# Altium footprint library Modules.PCBLIB: 11 footprints
Each footprint in its own frame and in the unit in brackets; x right, y up, seen from the top. Pads: shape width x height; smd on the part's side, far side on the other; paste and mask are expansions set on the pad; w line width, h text height; cw(c..) or ccw(c..) is an arc to the next point about the centre after c.
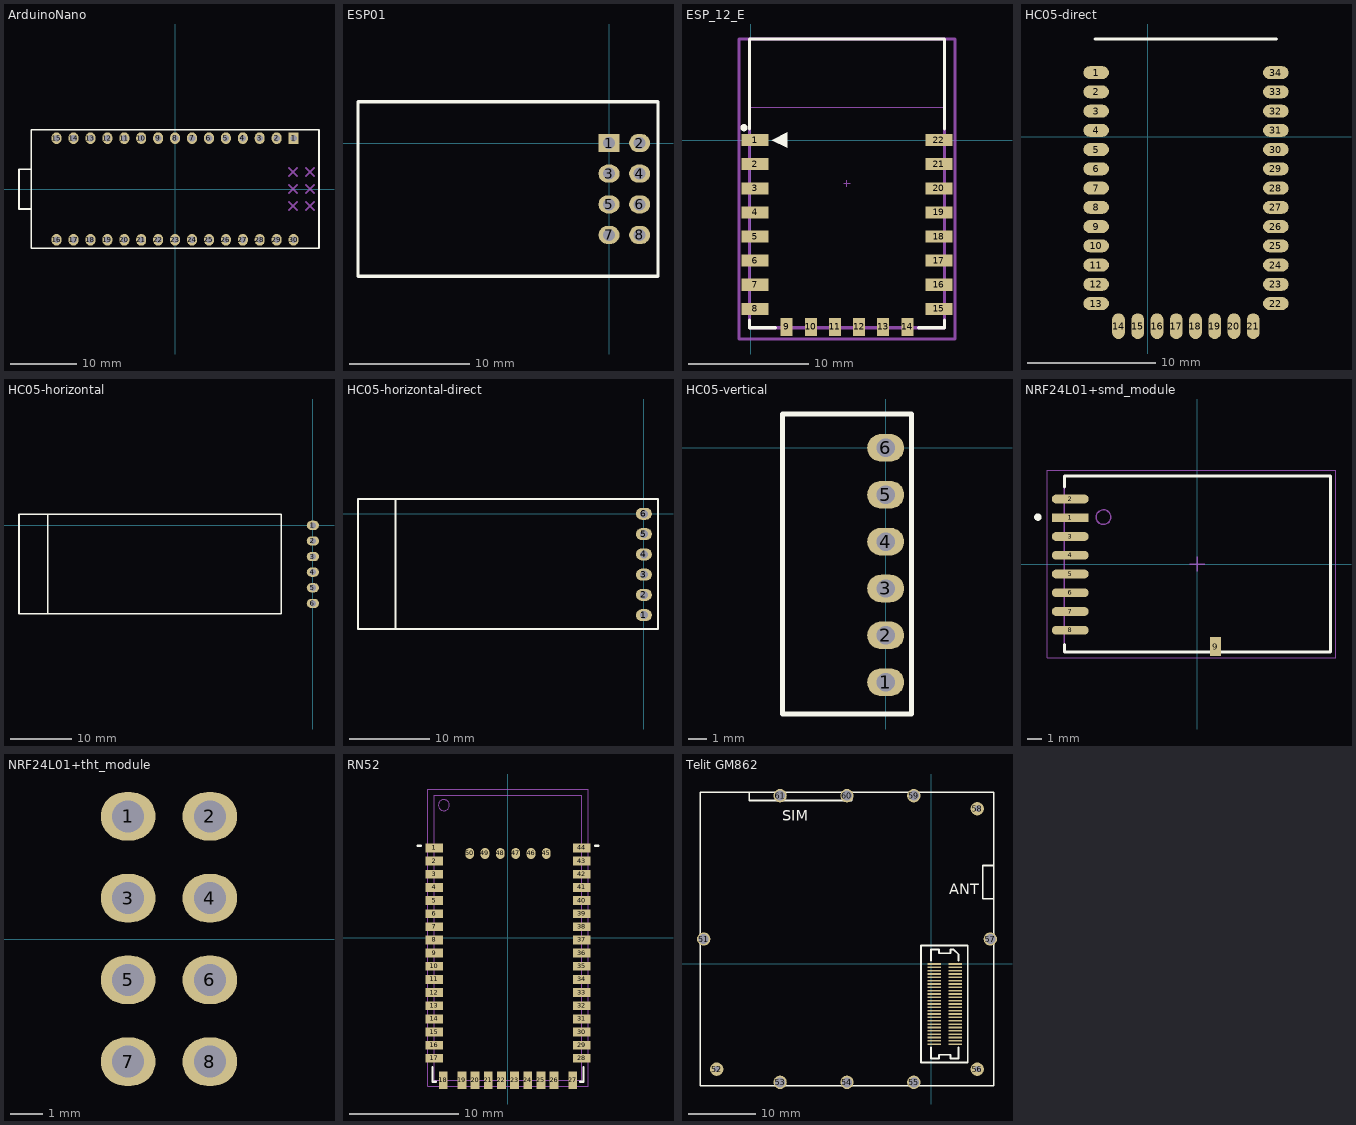
[diagram p0: the footprints below, top view; thin cyan lines are the x and y axes]

## ArduinoNano [mm]
pads (30):
  rect 1.5x1.75 hole 1: 1(17.78,7.62)
  oval 1.5x1.75 hole 1: 2(15.24,7.62) 3(12.7,7.62) 4(10.16,7.62) 5(7.62,7.62) 6(5.08,7.62) 7(2.54,7.62) 8(0,7.62) 9(-2.54,7.62) 10(-5.08,7.62) 11(-7.62,7.62) 12(-10.16,7.62) 13(-12.7,7.62) 14(-15.24,7.62) 15(-17.78,7.62) 16(-17.78,-7.62) 17(-15.24,-7.62) 18(-12.7,-7.62) 19(-10.16,-7.62) 20(-7.62,-7.62) 21(-5.08,-7.62) 22(-2.54,-7.62) 23(0,-7.62) 24(2.54,-7.62) 25(5.08,-7.62) 26(7.62,-7.62) 27(10.16,-7.62) 28(12.7,-7.62) 29(15.24,-7.62) 30(17.78,-7.62)
Top Overlay:
  lines w0.254: -21.59,-2.997 -23.419,-2.997 -23.419,2.972 -21.59,2.972 ; -21.59,2 -21.59,8.89 ; -21.59,8.89 -21.59,-8.89 21.59,-8.89 21.59,8.89 -21.59,8.89
Mechanical 3:
  lines w0.254: 17.043,-3.175 18.313,-1.905 ; 17.043,-1.905 18.313,-3.175 ; 17.043,-0.635 18.313,0.635 ; 17.043,0.635 18.313,-0.635 ; 17.043,1.905 18.313,3.175 ; 17.043,3.175 18.313,1.905 ; 19.583,-3.175 20.853,-1.905 ; 19.583,-1.905 20.853,-3.175 ; 19.583,-0.635 20.853,0.635 ; 19.583,0.635 20.853,-0.635 ; 19.583,1.905 20.853,3.175 ; 19.583,3.175 20.853,1.905
Top DesignatorDoc:
  text ".Designator" at 0,0 h1.5

## ESP01 [mm]
pads (8):
  rect 1.75x1.5 hole 1: 1(0,0)
  oval 1.75x1.5 hole 1: 2(2.54,0) 3(0,-2.54) 4(2.54,-2.54) 5(0,-5.08) 6(2.54,-5.08) 7(0,-7.62) 8(2.54,-7.62)
Top Overlay:
  lines w0.254: -20.828,-11.049 4.064,-11.049 4.064,3.429 -20.828,3.429 -20.828,-11.049
3D body "ESP-01.step": height 11.69, standoff 0.01, extent -20.76,-11.06 4.04,3.44

## ESP_12_E [mm]
pads (22):
  rect 2.25x1 smd: 1(0.375,0) 2(0.375,-2) 3(0.375,-4) 4(0.375,-6) 5(0.375,-8) 6(0.375,-10) 7(0.375,-12) 8(0.375,-14) 15(15.625,-14) 16(15.625,-12) 17(15.625,-10) 18(15.625,-8) 19(15.625,-6) 20(15.625,-4) 21(15.625,-2) 22(15.625,0)
  rect 1x1.5 smd: 9(3,-15.5) 10(5,-15.5) 11(7,-15.5) 12(9,-15.5) 13(11,-15.5) 14(13,-15.5)
Top Overlay:
  circle w0.3: c-0.55,1.025 r0.15
  region: 1.77,0 3.04,-0.635 3.04,0.635
  lines w0.254: -0.084,-14.916 -0.084,-15.568 2.068,-15.568 ; -0.084,0.916 -0.084,8.371 16.084,8.371 16.084,0.916 ; 13.932,-15.568 16.084,-15.568 16.084,-14.916
Top Body, 3D Models:
  lines w0.051: -0.127,2.727 16.129,2.727 16.129,8.382 -0.127,8.382 -0.127,2.727
  lines w0.254: -0.084,-15.568 -0.084,8.371 16.084,8.371 16.084,-15.568 -0.084,-15.568
  text "ANTENNA AREA" at 0.127,7.874 h0.25
  text "CUTOUT POLYGON" at 0.127,7.366 h0.25
Top Courtyard:
  lines w0.1: 7.746,-3.598 8.254,-3.598 ; 8,-3.852 8,-3.344
  lines w0.254: -0.975,-16.5 16.975,-16.5 16.975,8.371 -0.975,8.371 -0.975,-16.5
3D body "ESP_12_E.STEP": height 2.75, standoff 0.04, extent 0.001,-15.491 16.001,8.509

## HC05-direct [mm]
pads (34):
  rrect100% 2x1 smd: 1(-4,5) 2(-4,3.5) 3(-4,2) 4(-4,0.5) 5(-4,-1) 6(-4,-2.5) 7(-4,-4) 8(-4,-5.5) 9(-4,-7) 10(-4,-8.5) 11(-4,-10) 12(-4,-11.5) 13(-4,-13) 22(10,-13) 23(10,-11.5) 24(10,-10) 25(10,-8.5) 26(10,-7) 27(10,-5.5) 28(10,-4) 29(10,-2.5) 30(10,-1) 31(10,0.5) 32(10,2) 33(10,3.5) 34(10,5)
  rrect100% 1x2 smd: 14(-2.26,-14.76) 15(-0.76,-14.76) 16(0.74,-14.76) 17(2.24,-14.76) 18(3.74,-14.76) 19(5.24,-14.76) 20(6.74,-14.76) 21(8.24,-14.76)
Top Overlay:
  lines w0.254: -4.064,7.62 10.033,7.62
3D body "Bluetooth HC-05_.step": height 2.35, standoff 0, extent -4.02,-14.76 10,13.25

## HC05-horizontal [mm]
pads (6):
  oval 2x1.5 hole 1: 1(0,0) 2(0,-2.54) 3(0,-5.08) 4(0,-7.62) 5(0,-10.16) 6(0,-12.7)
Top Overlay:
  lines w0.254: -43.133,-14.421 -43.133,1.835 ; -47.832,-14.421 -5.16,-14.421 -5.16,1.835 -47.832,1.835 -47.832,-14.421
3D body "hc05.step": height 7, standoff 1.1, extent -47.832,-14.264 -5.232,1.836

## HC05-horizontal-direct [mm]
pads (6):
  oval 2x1.5 hole 1: 1(0,-12.7) 2(0,-10.16) 3(0,-7.62) 4(0,-5.08) 5(0,-2.54) 6(0,0)
Top Overlay:
  lines w0.254: -31.133,-14.421 -31.133,1.835 ; -35.832,-14.421 -35.832,1.835 1.76,1.835 1.76,-14.421 -35.832,-14.421
3D body "hc05.step": height 5.9, standoff 0, extent -35.75,-14.3 6.85,1.8

## HC05-vertical [mm]
pads (6):
  oval 2x1.5 hole 1: 1(0,-12.7) 2(0,-10.16) 3(0,-7.62) 4(0,-5.08) 5(0,-2.54) 6(0,0)
Top Overlay:
  lines w0.254: -5.588,-14.421 1.397,-14.421 1.397,1.835 -5.588,1.835 -5.588,-14.421
3D body "hc05.step": height 42.61, standoff 0.01, extent -5.482,-14.34 0.433,1.76

## NRF24L01+smd_module [mm]
height 1.75
pads (9):
  rect 2.5x0.6 smd: 1(-8.6,3.131)
  oval 2.5x0.6 smd: 2(-8.6,4.401) 3(-8.6,1.861) 4(-8.6,0.591) 5(-8.6,-0.679) 6(-8.6,-1.949) 7(-8.6,-3.219) 8(-8.6,-4.489)
  rect 0.762x1.27 smd: 9(1.245,-5.588)
Top Overlay:
  circle w0.25: c-10.795,3.175 r0.125
  lines w0.2: -9,-5.461 -9,-5.969 9.017,-5.969 9.017,5.969 -9,5.969 -9,5.207
Top Body, 3D Models:
  circle w0.1: c-6.35,3.175 r0.5
  lines w0.1: -9.017,-5.969 -9.017,5.969 9.017,5.969 9.017,-5.969 -9.017,-5.969
Top Courtyard:
  lines w0.05: -10.16,-6.35 -10.16,6.35 9.398,6.35 9.398,-6.35 -10.16,-6.35
  lines w0.1: -0.5,0 0.5,0 ; 0,-0.5 0,0.5
3D body "nrf24l01+smd.step": height 0.8, standoff 0, extent -9,-6 9,6

## NRF24L01+tht_module [mm]
pads (8):
  oval 1.7x1.5 hole 1: 1(-10.16,3.81) 2(-7.62,3.81) 3(-10.16,1.27) 4(-7.62,1.27) 5(-10.16,-1.27) 6(-7.62,-1.27) 7(-10.16,-3.81) 8(-7.62,-3.81)
3D body "NRF24L01-tht.STEP": height 6.21, standoff -6.24, extent -11.753,-9.615 17.247,5.385

## RN52 [mm] "RN52 module - custom footprint"
height 2.7
pads (50):
  rect 1.6x0.8 smd: 1(-6.75,8.2) 2(-6.75,7) 3(-6.75,5.8) 4(-6.75,4.6) 5(-6.75,3.4) 6(-6.75,2.2) 7(-6.75,1) 8(-6.75,-0.2) 9(-6.75,-1.4) 10(-6.75,-2.6) 11(-6.75,-3.8) 12(-6.75,-5) 13(-6.75,-6.2) 14(-6.75,-7.4) 15(-6.75,-8.6) 16(-6.75,-9.8) 17(-6.75,-11) 28(6.75,-11) 29(6.75,-9.8) 30(6.75,-8.6) 31(6.75,-7.4) 32(6.75,-6.2) 33(6.75,-5) 34(6.75,-3.8) 35(6.75,-2.6) 36(6.75,-1.4) 37(6.75,-0.2) 38(6.75,1) 39(6.75,2.2) 40(6.75,3.4) 41(6.75,4.6) 42(6.75,5.8) 43(6.75,7) 44(6.75,8.2)
  rect 0.8x1.6 smd: 18(-5.9,-13) 19(-4.2,-13) 20(-3,-13) 21(-1.8,-13) 22(-0.6,-13) 23(0.6,-13) 24(1.8,-13) 25(3,-13) 26(4.2,-13) 27(5.9,-13)
  oval 0.8x1 smd: 45(3.5,7.7) 46(2.1,7.7) 47(0.7,7.7) 48(-0.7,7.7) 49(-2.1,7.7) 50(-3.5,7.7)
Top Overlay:
  lines w0.2: -8.25,8.4 -7.95,8.4 ; -6.9,-11.796 -6.9,-13.146 -6.6,-13.146 ; 6.6,-13.146 6.9,-13.146 6.9,-11.796 ; 7.95,8.4 8.25,8.4
Top Body, 3D Models:
  circle w0.1: c-5.85,12.104 r0.5
  lines w0.1: -6.75,-12.996 6.75,-12.996 6.75,13.004 -6.75,13.004 -6.75,-12.996
Top Courtyard:
  lines w0.05: -7.325,-13.571 7.325,-13.571 7.325,13.579 -7.325,13.579 -7.325,-13.571
3D body "User Library-RN52.STEP": height 2.72, standoff -0.01, extent -6.75,-13 6.77,13.01

## Telit GM862 [mm]
pads (61):
  rect 2x0.25 smd: 1(0.5,0) 2(3.6,0) 3(0.5,-0.5) 4(3.6,-0.5) 5(0.5,-1) 6(3.6,-1) 7(0.5,-1.5) 8(3.6,-1.5) 9(0.5,-2) 10(3.6,-2) 11(0.5,-2.5) 12(3.6,-2.5) 13(0.5,-3) 14(3.6,-3) 15(0.5,-3.5) 16(3.6,-3.5) 17(0.5,-4) 18(3.6,-4) 19(0.5,-4.5) 20(3.6,-4.5) 21(0.5,-5) 22(3.6,-5) 23(0.5,-5.5) 24(3.6,-5.5) 25(0.5,-6) 26(3.6,-6) 27(0.5,-6.5) 28(3.6,-6.5) 29(0.5,-7) 30(3.6,-7) 31(0.5,-7.5) 32(3.6,-7.5) 33(0.5,-8) 34(3.6,-8) 35(0.5,-8.5) 36(3.6,-8.5) 37(0.5,-9) 38(3.6,-9) 39(0.5,-9.5) 40(3.6,-9.5) 41(0.5,-10) 42(3.6,-10) 43(0.5,-10.5) 44(3.6,-10.5) 45(0.5,-11) 46(3.6,-11) 47(0.5,-11.5) 48(3.6,-11.5) 49(0.5,-12) 50(3.6,-12)
  round 2 hole 1.5 unplated: 51(-34.031,3.73) 53(-22.593,-17.716) 54(-12.586,-17.716) 55(-2.578,-17.716) 57(8.873,3.73) 59(-2.578,25.188) 60(-12.586,25.188) 61(-22.593,25.188)
  round 2 hole 0.9 unplated: 52(-32.093,-15.752) 56(6.921,-15.752) 58(6.921,23.237)
Top Overlay:
  lines w0.254: -34.532,-18.216 9.367,-18.216 ; -34.531,-18.217 -34.531,25.683 ; -34.526,25.688 9.374,25.688 ; -27.231,25.688 -27.231,24.46 -11.881,24.46 -11.881,25.688 ; -1.499,-14.74 -1.499,2.76 ; -1.493,-14.736 5.506,-14.736 ; -1.493,2.765 5.506,2.765 ; 0,-12.5 0,-14.15 1.2,-14.15 1.2,-13.6 2.9,-13.6 2.9,-14.15 4.1,-14.15 4.1,-12.5 ; 0,0.5 0,2.15 1.2,2.15 1.2,1.6 2.9,1.6 2.9,2.15 3.4,2.15 4.1,1.45 4.1,0.5 ; 5.512,-14.74 5.512,2.76 ; 9.373,-18.217 9.373,25.683 ; 9.373,9.738 7.76,9.738 7.76,14.738 9.373,14.738
  text "SIM" at -22.24,21.46 h1.59
  text "ANT" at 2.76,10.46 h1.59
3D body "User Library-GM862-GPS.STEP": height 6.7, standoff -1.4, extent -34.521,-18.406 9.679,26.594